# Altium footprint library Connectors.PcbLib: 73 footprints (part 3 of 5)
Each footprint in its own frame and in the unit in brackets; x right, y up, seen from the top. Pads: shape width x height; smd on the part's side, far side on the other; paste and mask are expansions set on the pad; w line width, h text height; cw(c..) or ccw(c..) is an arc to the next point about the centre after c.
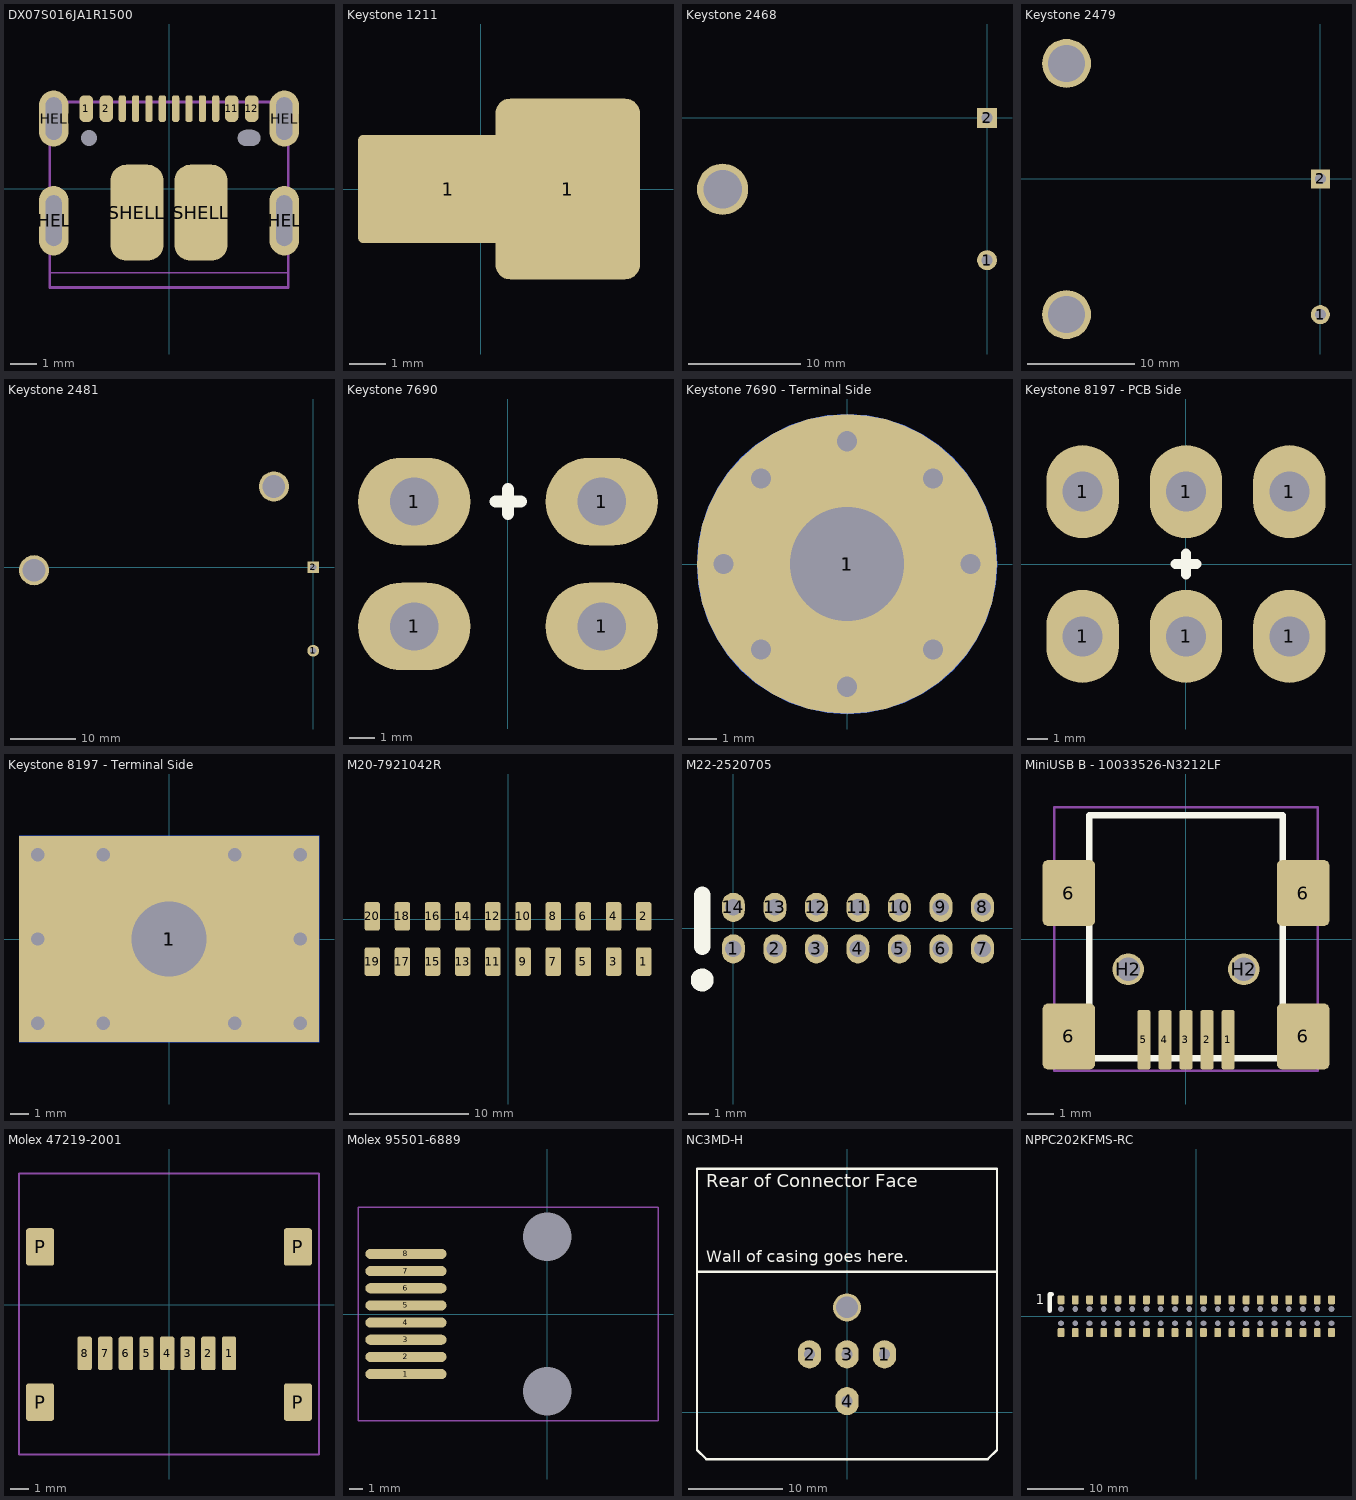
[diagram p2: the footprints below, top view; thin cyan lines are the x and y axes]

## DX07S016JA1R1500 [mm] "USB-C (USB TYPE-C) USB 2.0 Receptacle Connector 24 (16+8 Dummy) Position Surface Mount, Right Angle; Through Hole"
pads (20):
  rrect70% 0.5x1 smd paste-0.05 mask+0.05: 1(-3.1,3) 2(-2.35,3) 11(2.35,3) 12(3.1,3)
  rrect70% 0.27x1 smd paste-0.04 mask+0.05: 3(-1.75,3) 4(-1.25,3) 5(-0.75,3) 6(-0.25,3) 7(0.25,3) 8(0.75,3) 9(1.25,3) 10(1.75,3)
  rrect100% 1.1x2.6 hole 0.6 slot 1.9 at 90 deg paste-99 mask+0.1: SHELL(-4.32,-1.2) SHELL(4.32,-1.2)
  rrect100% 1.1x2.1 hole 0.6 slot 1.6 at 90 deg paste-99 mask+0.1: SHELL(-4.32,2.625) SHELL(4.32,2.625)
  rrect60% 2x3.6 smd paste-0.12 mask+0.05: SHELL(-1.2,-0.9) SHELL(1.2,-0.9)
  round 0 hole 0.6: ""(-3,1.9)
  round 0 hole 0.6 slot 0.85 at 0 deg: ""(3,1.9)
Top Paste:
  lines w0.6: -4.9,-1.925 -4.9,-0.525 ; -3.74,-1.875 -3.74,-0.475 ; 3.74,-1.925 3.74,-0.525 ; 4.9,-1.875 4.9,-0.475
  lines w0.7: -4.9,1.9 -4.9,3.3 ; 4.9,1.95 4.9,3.35
Assembly:
  lines w0.05: -4.47,-3.15 4.47,-3.15
  lines w0.1: -4.47,-3.7 -4.47,3.25 4.47,3.25 4.47,-3.7 -4.47,-3.7
  text ".Designator" at -3.5,-0.7 h1.1
3D body "K3D-DX07S016JA1-V1_JAE_Proprietary.STEP": height 3.18, standoff -0.88, extent -4.47,-3.65 4.47,3.25

## Keystone 1211 [mm] "0.110\" QC, laying flat"
pads (2):
  rrect10% 5x3 smd paste-0.5: 1(-0.9,0)
  rrect20% 4x5 smd paste-0.5: 1(2.4,0)
3D body "keystone-PN1211.STEP": height 0.81, standoff 0, extent -2.783,-1.962 10.983,2

## Keystone 2468 [mil]
pads (3):
  round 70 hole 40 paste-3897.64: 1(0,-500)
  rect 70x70 hole 40 paste-3897.64: 2(0,0)
  round 180 hole 136: ""(-929.13,-250.98)
3D body "keystone-PN2468.STEP": height 540.83, standoff -479.6, extent -1973.01,-732.98 112.99,235.02

## Keystone 2479 [mil]
pads (4):
  round 70 hole 40 paste-3897.64: 1(0,-500)
  rect 70x70 hole 40 paste-3897.64: 2(0,0)
  round 180 hole 136: ""(-935,-500) ""(-935,425)
3D body "keystone-PN2479.STEP": height 524.34, standoff -496.1, extent -1969.97,-775 116,701

## Keystone 2481 [mil]
pads (4):
  round 70 hole 40 paste-3897.64: 1(0,-500)
  rect 70x70 hole 40 paste-3897.64: 2(0,0)
  round 180 hole 136: ""(-1672.24,-17.72) ""(-235.24,484.25)
3D body "keystone-PN2481.STEP": height 529.2, standoff -491.3, extent -2008.58,-739.24 97.42,1240.76

## Keystone 7690 [mm] "15A Right Angle Screw Terminal"
pads (4):
  oval 4.5x3.5 hole 1.93: 1(-3.745,-9.982) 1(-3.745,-4.982) 1(3.755,-9.982) 1(3.755,-4.982)
Top Overlay:
  lines w0.5: -0.495,-4.982 0.505,-4.982 ; 0.005,-5.482 0.005,-4.482
3D body "keystone-PN7690_NoScrew.STEP": height 7.8, standoff -5.21, extent -5.197,-11.566 5.205,0.002

## Keystone 7690 - Terminal Side [mm] "15A Screw Terminal"
pads (3):
  round 10 hole 4: 1(0,0)
  round 10.5 smd paste-99 mask+0: 1(0,0)
  round 10.5 smd far side paste-99 mask+0: 1(0,0)
via 0,-4.3 diameter 1.27 hole 0.711
via -3.008,-2.992 diameter 1.27 hole 0.711
via 3.008,-2.992 diameter 1.27 hole 0.711
via 3.008,2.992 diameter 1.27 hole 0.711
via -3.008,2.992 diameter 1.27 hole 0.711
via -4.323,0 diameter 1.27 hole 0.711
via 4.323,0 diameter 1.27 hole 0.711
via 0,4.3 diameter 1.27 hole 0.711

## Keystone 8197 - PCB Side [mm] "30A Screw Terminal"
pads (6):
  oval 3.5x4.5 hole 1.93 paste-99: 1(-5,-3.5) 1(-5,3.5) 1(0,-3.5) 1(0,3.5) 1(5,-3.5) 1(5,3.5)
Top Overlay:
  lines w0.5: -0.5,0 0.5,0 ; 0,-0.5 0,0.5
3D body "keystone-PN8197_PCBScrew.STEP": height 10.06, standoff -5.31, extent -6.455,-4.484 6.422,4.533

## Keystone 8197 - Terminal Side [mm] "30A Screw Terminal"
pads (3):
  rect 16x11 smd paste-99: 1(0,0)
  rect 16x11 smd far side paste-99: 1(0,0)
  round 11 hole 4 paste-99: 1(0,0)
via -7,4.5 diameter 1.27 hole 0.711
via 7,4.5 diameter 1.27 hole 0.711
via 7,-4.5 diameter 1.27 hole 0.711
via -7,-4.5 diameter 1.27 hole 0.711
via -3.5,-4.5 diameter 1.27 hole 0.711
via 3.5,-4.5 diameter 1.27 hole 0.711
via 3.5,4.5 diameter 1.27 hole 0.711
via -3.5,4.5 diameter 1.27 hole 0.711
via -7,0 diameter 1.27 hole 0.711
via 7,0 diameter 1.27 hole 0.711
Top Overlay:
  lines w0.5: -0.5,0 0.5,0 ; 0,-0.5 0,0.5

## M20-7921042R [mm] "20 Position Receptacle Connector 0.100\" (2.54mm) Surface Mount, Right Angle Gold"
pads (20):
  rrect30% 1.3x2.4 smd paste-0.04 mask+0.092: 1(11.43,-3.556) 2(11.43,0.254) 3(8.89,-3.556) 4(8.89,0.254) 5(6.35,-3.556) 6(6.35,0.254) 7(3.81,-3.556) 8(3.81,0.254) 9(1.27,-3.556) 10(1.27,0.254) 11(-1.27,-3.556) 12(-1.27,0.254) 13(-3.81,-3.556) 14(-3.81,0.254) 15(-6.35,-3.556) 16(-6.35,0.254) 17(-8.89,-3.556) 18(-8.89,0.254) 19(-11.43,-3.556) 20(-11.43,0.254)
3D body "m20-7921042_asm.stp": height 5, standoff 0, extent -12.686,-4.15 12.714,11.25

## M22-2520705 [mm] "14-pin male header, 2mm pitch"
pads (14):
  oval 1.1x1.4 hole 0.8 paste-99: 1(0,-1) 2(2,-1) 3(4,-1) 4(6,-1) 5(8,-1) 6(10,-1) 7(12,-1) 8(12,1) 9(10,1) 10(8,1) 11(6,1) 12(4,1) 13(2,1) 14(0,1)
Top Overlay:
  circle w0.6: c-1.5,-2.5 r0.25
  lines w0.8: -1.5,-0.89 -1.5,1.6
3D body "m22-2520705_asm.stp": height 5, standoff -2.3, extent -1,-2 13,2

## MiniUSB B - 10033526-N3212LF [mm]
pads (11):
  rrect30% 0.5x2.25 smd paste-0.04 mask+0.092: 1(1.6,-3.828) 2(0.8,-3.828) 3(0,-3.828) 4(-0.8,-3.828) 5(-1.6,-3.828)
  rrect20% 2x2.5 smd paste-0.05: 6(-4.45,-3.703) 6(-4.45,1.747) 6(4.45,-3.703) 6(4.45,1.747)
  round 1.2 hole 0.9: H2(-2.2,-1.153) H2(2.2,-1.153)
Top Overlay:
  lines w0.254: -3.675,-4.528 3.675,-4.528 3.675,4.697 -3.675,4.697 -3.675,-4.528
Assembly:
  lines w0.1: -5,-5 -5,5 5,5 5,-5 -5,-5
  text ".Designator" at -2.4,-0.2 h1.1
3D body "i10033526_CLEAN.STEP": height 4.04, standoff -0.96, extent -4.95,-4.703 4.95,4.697

## Molex 47219-2001 [mm] "Hinge-style MicroSD card holder"
height 1.9
pads (12):
  rrect30% 0.77x1.8 smd paste-0.025: 1(3.2,-2.6) 2(2.1,-2.6) 3(1,-2.6) 4(-0.1,-2.6) 5(-1.2,-2.6) 6(-2.3,-2.6) 7(-3.4,-2.6) 8(-4.5,-2.6)
  rrect20% 1.5x2 smd paste-0.025: P(-6.875,-5.2) P(-6.875,3.075) P(6.875,-5.2) P(6.875,3.075)
Assembly:
  lines w0.1: -8,-8 8,-8 8,7 -8,7 -8,-8
  text ".Designator" at -2.4,-0.3 h1.1
3D body "Micro SD Card.STEP": height 1.7, standoff 0.7, extent -5.506,-8.3 5.506,6.7
3D body "472192001.stp": height 1.91, standoff 0.02, extent -7.3,-7.75 7.3,6.75

## Molex 95501-6889 [mm]
pads (10):
  rrect100% 6x0.76 smd paste-0.08: 1(-10.455,-4.445) 2(-10.455,-3.175) 3(-10.455,-1.905) 4(-10.455,-0.635) 5(-10.455,0.635) 6(-10.455,1.905) 7(-10.455,3.175) 8(-10.455,4.445)
  round 0 hole 3.6 paste-99: GND(0,-5.715) GND(0,5.715)
Assembly:
  lines w0.1: -14,-7.9 -14,7.9 8.2,7.9 8.2,-7.9 -14,-7.9
  text ".Designator" at -6.4,-0.2 h1.1
3D body "955016889.stp": height 11.55, standoff -2.95, extent -12.657,-7.619 7.893,7.621

## NC3MD-H [mm]
pads (5):
  oval 2.5x3 hole 1.2: 1(4,6.2) 2(-4,6.2) 3(0,6.2) 4(0,1.2)
  round 3 hole 2.3: ""(0,11.2)
Top Overlay:
  lines w0.254: -16,15 16,15 ; -16,-4 -15,-5 14,-5 15,-5 16,-4 16,-1 16,26 -16,26 -16,2 -16,-4
  text "Rear of Connector Face" at -15,24 h1.4
  text "Wall of casing goes here." at -15,16 h1.25
3D body "3D+File+NC3MD-H.stp": height 28, standoff -3.5, extent -13,0 13,31.4

## NPPC202KFMS-RC [mm]
pads (80):
  rrect30% 1.2x1.6 smd paste-0.03: 1(-24.13,2.921) 2(-24.13,-2.921) 3(-21.59,2.921) 4(-21.59,-2.921) 5(-19.05,2.921) 6(-19.05,-2.921) 7(-16.51,2.921) 8(-16.51,-2.921) 9(-13.97,2.921) 10(-13.97,-2.921) 11(-11.43,2.921) 12(-11.43,-2.921) 13(-8.89,2.921) 14(-8.89,-2.921) 15(-6.35,-2.921) 16(-6.35,2.921) 17(-3.81,-2.921) 18(-3.81,2.921) 19(-1.27,-2.921) 20(-1.27,2.921) 21(1.27,-2.921) 22(1.27,2.921) 23(3.81,-2.921) 24(3.81,2.921) 25(6.35,-2.921) 26(6.35,2.921) 27(8.89,-2.921) 28(8.89,2.921) 29(11.43,-2.921) 30(11.43,2.921) 31(13.97,-2.921) 32(13.97,2.921) 33(16.51,-2.921) 34(16.51,2.921) 35(19.05,-2.921) 36(19.05,2.921) 37(21.59,-2.921) 38(21.59,2.921) 39(24.13,-2.921) 40(24.13,2.921)
  round 0 hole 1.02 paste-99: ""(-24.13,-1.27) ""(-24.13,1.27) ""(-21.59,-1.27) ""(-21.59,1.27) ""(-19.05,-1.27) ""(-19.05,1.27) ""(-16.51,-1.27) ""(-16.51,1.27) ""(-13.97,-1.27) ""(-13.97,1.27) ""(-11.43,-1.27) ""(-11.43,1.27) ""(-8.89,-1.27) ""(-8.89,1.27) ""(-6.35,-1.27) ""(-6.35,1.27) ""(-3.81,-1.27) ""(-3.81,1.27) ""(-1.27,-1.27) ""(-1.27,1.27) ""(1.27,-1.27) ""(1.27,1.27) ""(3.81,-1.27) ""(3.81,1.27) ""(6.35,-1.27) ""(6.35,1.27) ""(8.89,-1.27) ""(8.89,1.27) ""(11.43,-1.27) ""(11.43,1.27) ""(13.97,-1.27) ""(13.97,1.27) ""(16.51,-1.27) ""(16.51,1.27) ""(19.05,-1.27) ""(19.05,1.27) ""(21.59,-1.27) ""(21.59,1.27) ""(24.13,-1.27) ""(24.13,1.27)
Top Overlay:
  lines w0.8: -26.16,0.93 -26.16,3.93 -25.8,3.93
  text "1" at -28.6,1.5 h3
3D body "_ _ _C202KFMS-RC.STEP": height 7.5, standoff 0, extent -25.65,-3.425 25.65,3.421